# Altium integrated library diplom.IntLib: 88 symbols (part 2 of 2)

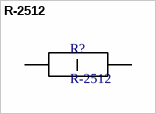
[diagram p23: symbol R-2512]

## R-2512
designator R?
No Description Available; Manufacturer_Part_Number: TL3AR033F; Vendor: TE Connectivity; Built_By: EMA_UL_Team; SourceLibrary: Tyco_2012-01-31a; Copyright: Copyright (C) 2018 Accelerated Designs. All rights reserved; RefDes: RefDes; Type: DEV
footprint RES2512_TL_TYCO_TYC
pins: 1, 2


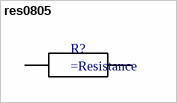
[diagram p24: symbol res0805]

## res0805
designator R?
Resistor 0805
footprint G-21_MUR
pins: 1, 2


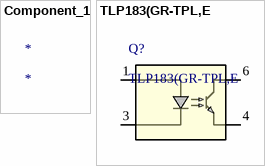
[diagram p25: symbols Component_1 to TLP183(GR-TPL,E]

## Component_1
designator *
footprint 4pin SO6_TOS

## TLP183(GR-TPL,E
designator Q?
No Description Available; Vendor: Toshiba; Built_By: EMA_UL_Team; SourceLibrary: Toshiba_2019-12-10; Type: DEV; Number_devices_in_Package: 1; Manufacturer_Part_Number: TLP183(GR-TPL,E; Copyright: Copyright (C) 2018 Accelerated Designs. All rights reserved; RefDes: RefDes; Source_Package: TLP183
footprint 4pin SO6_TOS
pins: 1, 3, 4, 6